# Altium footprint library 5ko.PcbLib: 126 footprints (part 5 of 8)
Each footprint in its own frame and in the unit in brackets; x right, y up, seen from the top. Pads: shape width x height; smd on the part's side, far side on the other; paste and mask are expansions set on the pad; w line width, h text height; cw(c..) or ccw(c..) is an arc to the next point about the centre after c.
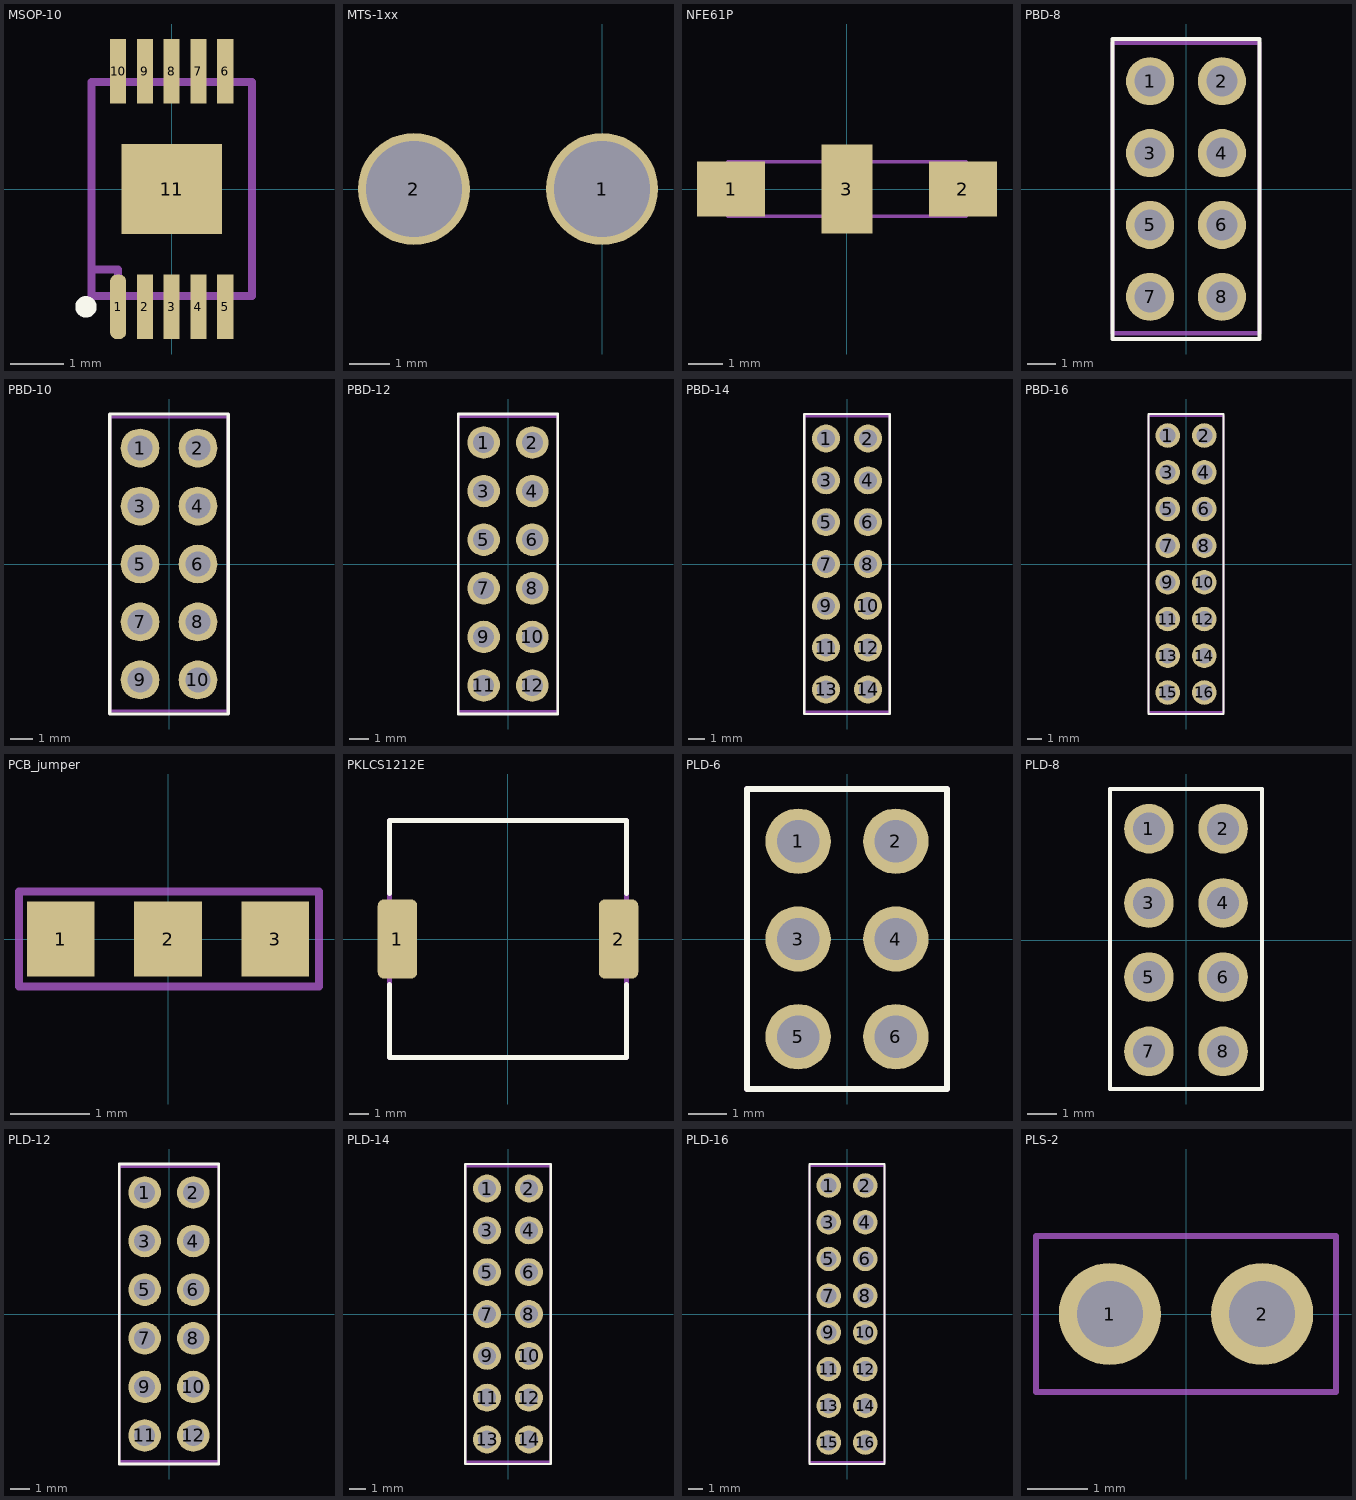
[diagram p4: the footprints below, top view; thin cyan lines are the x and y axes]

## MSOP-10 [mm]
pads (11):
  rrect80% 0.3x1.2 smd mask+0.07: 1(-1,-2.2)
  rect 0.3x1.2 smd mask+0.07: 2(-0.5,-2.2) 3(0,-2.2) 4(0.5,-2.2) 5(1,-2.2) 6(1,2.2) 7(0.5,2.2) 8(0,2.2) 9(-0.5,2.2) 10(-1,2.2)
  rect 1.88x1.68 smd mask+0.07: 11(0,0)
Top Overlay:
  circle w0.2: c-1.6,-2.2 r0.1
Mechanical 15:
  lines w0.15: -1.5,-1.5 -1,-1.5 -1,-2 ; -1.5,-2 1.5,-2 1.5,2 -1.5,2 -1.5,-2
  text ".Designator" at 0.125,-2.1 h0.5
3D body "User Library-MSOP-10-1.step": height 1.05, standoff 0, extent -1.5,-2.514 1.5,2.514

## MTS-1xx [mm]
pads (2):
  round 2.8 hole 2.4 unplated: 1(0,0) 2(-4.7,0)
3D body "MTS-1xx-C2-blue-OFF.step": height 26.03, standoff -5.5, extent -6.8,-5.999 6.6,6

## NFE61P [mm]
pads (3):
  rect 2x1.6 smd: 1(-3.4,0) 2(3.4,0)
  rect 1.5x2.6 smd: 3(0,0)
Mechanical 15:
  lines w0.1: -3.5,-0.8 -3.5,0.8 3.5,0.8 3.5,-0.8 -3.5,-0.8
  text ".Designator" at -1.7,-0.2 h0.5
3D body "NFE61P.STEP": height 1.6, standoff 0, extent -3.4,-0.8 3.4,0.8

## PBD-8 [mm]
pads (8):
  round 1.7 hole 1.1: 1(-1.27,3.81) 2(1.27,3.81) 3(-1.27,1.27) 4(1.27,1.27) 5(-1.27,-1.27) 6(1.27,-1.27) 7(-1.27,-3.81) 8(1.27,-3.81)
Top Overlay:
  lines w0.15: -2.6,-5.3 -2.6,5.3 2.6,5.3 2.6,-5.3 -2.6,-5.3
Mechanical 15:
  lines w0.15: -2.6,-5.1 -2.6,5.17 2.6,5.17 2.6,-5.1 -2.6,-5.1
  text ".Designator" at -1.5,-0.1 h0.5
3D body "User Library-PBD_(DS1023-2)_2line_connectors_h=5_0_8_5mm_step_2_54mm_fixed.step": height 8.5, standoff -3, extent -2.5,-5.32 2.5,5.34

## PBD-10 [mm]
pads (10):
  round 1.7 hole 1.1: 1(-1.27,5.08) 2(1.27,5.08) 3(-1.27,2.54) 4(1.27,2.54) 5(-1.27,0) 6(1.27,0) 7(-1.27,-2.54) 8(1.27,-2.54) 9(-1.27,-5.08) 10(1.27,-5.08)
Top Overlay:
  lines w0.15: -2.6,-6.57 2.6,-6.57 2.6,6.57 -2.6,6.57 -2.6,-6.57
Mechanical 15:
  lines w0.15: -2.6,-6.44 2.6,-6.44 2.6,6.44 -2.6,6.44 -2.6,-6.44
  text ".Designator" at -1.1,-0.2 h0.5
3D body "PBD-10.step": height 8.5, standoff -3, extent -2.48,-6.6 2.52,6.6

## PBD-12 [mm]
pads (12):
  round 1.7 hole 1.1: 1(-1.27,6.35) 2(1.27,6.35) 3(-1.27,3.81) 4(1.27,3.81) 5(-1.27,1.27) 6(1.27,1.27) 7(-1.27,-1.27) 8(1.27,-1.27) 9(-1.27,-3.81) 10(1.27,-3.81) 11(-1.27,-6.35) 12(1.27,-6.35)
Top Overlay:
  lines w0.15: -2.6,-7.84 2.6,-7.84 ; -2.6,-7.83 -2.6,7.84 2.6,7.84 2.6,-7.83
Mechanical 15:
  lines w0.15: -2.6,-7.71 -2.6,7.71 2.6,7.71 2.6,-7.71 -2.6,-7.71
  text ".Designator" at -1,-0.1 h0.5
3D body "PBD-12.step": height 8.5, standoff -3, extent -2.48,-7.87 2.52,7.87

## PBD-14 [mm]
pads (14):
  round 1.7 hole 1.1: 1(-1.27,7.62) 2(1.27,7.62) 3(-1.27,5.08) 4(1.27,5.08) 5(-1.27,2.54) 6(1.27,2.54) 7(-1.27,0) 8(1.27,0) 9(-1.27,-2.54) 10(1.27,-2.54) 11(-1.27,-5.08) 12(1.27,-5.08) 13(-1.27,-7.62) 14(1.27,-7.62)
Top Overlay:
  lines w0.15: -2.6,-9.11 -2.6,9.11 2.6,9.11 2.6,-9.11 -2.6,-9.11
Mechanical 15:
  lines w0.15: -2.6,-8.98 -2.6,8.98 2.6,8.98 2.6,-8.98 -2.6,-8.98
  text ".Designator" at -0.925,-0.025 h0.5
3D body "PBD-14.step": height 8.5, standoff -3, extent -2.48,-9.14 2.52,9.14

## PBD-16 [mm]
pads (16):
  round 1.7 hole 1.1: 1(-1.27,8.89) 2(1.27,8.89) 3(-1.27,6.35) 4(1.27,6.35) 5(-1.27,3.81) 6(1.27,3.81) 7(-1.27,1.27) 8(1.27,1.27) 9(-1.27,-1.27) 10(1.27,-1.27) 11(-1.27,-3.81) 12(1.27,-3.81) 13(-1.27,-6.35) 14(1.27,-6.35) 15(-1.27,-8.89) 16(1.27,-8.89)
Top Overlay:
  lines w0.15: -2.6,-10.38 2.6,-10.38 2.6,10.38 -2.6,10.38 -2.6,-10.38
Mechanical 15:
  lines w0.15: -2.6,-10.25 2.6,-10.25 2.6,10.25 -2.6,10.25 -2.6,-10.25
  text ".Designator" at -0.925,1.245 h0.5
3D body "PBD-16.step": height 8.5, standoff -3, extent -2.48,-10.41 2.52,10.41

## PCB_jumper [mm]
pads (3):
  rect 0.85x0.95 smd: 1(-1.35,0) 2(0,0) 3(1.35,0)
Mechanical 15:
  lines w0.1: -1.875,-0.6 -1.875,0.6 1.9,0.6 1.9,-0.6 -1.875,-0.6
  text ".Designator" at -0.8,-0.1 h0.3

## PKLCS1212E [mm] "Buzzer"
pads (2):
  rrect30% 2x4 smd: 1(-5.6,0) 2(5.6,0)
Top Overlay:
  lines w0.254: -6,-2.3 -6,-6 6,-6 6,-2.3 ; -6,2.3 -6,6 6,6 6,2.3
Mechanical 15:
  lines w0.254: -6,-6 6,-6 6,6 -6,6 -6,-6
  text ".Designator" at -1.7,-0.2 h0.5
3D body "User Library-PKLCS1212E2XXX.STEP": height 3, standoff 0, extent -6,-6 6,6

## PLD-6 [mm]
pads (6):
  round 1.7 hole 1.1: 1(-1.27,2.54) 2(1.27,2.54) 3(-1.27,0) 4(1.27,0) 5(-1.27,-2.54) 6(1.27,-2.54)
Top Overlay:
  lines w0.15: -2.6,-3.9 -2.6,3.9 2.6,3.9 2.6,-3.9 -2.6,-3.9
Mechanical 15:
  lines w0.15: -2.6,-3.9 -2.6,3.9 2.6,3.9 2.6,-3.9 -2.6,-3.9
  text ".Designator" at -1.7,-0.3 h0.5
3D body "User Library-2x3 TH Pitch 2_54mm.STEP": height 9.2, standoff -3.5, extent -2.555,-3.81 2.525,3.81

## PLD-8 [mm]
pads (8):
  round 1.7 hole 1.1: 1(-1.27,3.81) 2(1.27,3.81) 3(-1.27,1.27) 4(1.27,1.27) 5(-1.27,-1.27) 6(1.27,-1.27) 7(-1.27,-3.81) 8(1.27,-3.81)
Top Overlay:
  lines w0.15: -2.6,-5.1 -2.6,5.17 2.6,5.17 2.6,-5.1 -2.6,-5.1
Mechanical 15:
  lines w0.15: -2.6,-5.1 -2.6,5.17 2.6,5.17 2.6,-5.1 -2.6,-5.1
  text ".Designator" at -1.5,-0.1 h0.5
3D body "User Library-PLD8.STEP": height 8.54, standoff -3, extent -2.54,-5.07 2.54,5.09

## PLD-12 [mm]
pads (12):
  round 1.7 hole 1.1: 1(-1.27,6.35) 2(1.27,6.35) 3(-1.27,3.81) 4(1.27,3.81) 5(-1.27,1.27) 6(1.27,1.27) 7(-1.27,-1.27) 8(1.27,-1.27) 9(-1.27,-3.81) 10(1.27,-3.81) 11(-1.27,-6.35) 12(1.27,-6.35)
Top Overlay:
  lines w0.15: -2.6,-7.84 2.6,-7.84 ; -2.6,-7.83 -2.6,7.84 2.6,7.84 2.6,-7.83
Mechanical 15:
  lines w0.15: -2.6,-7.71 -2.6,7.71 2.6,7.71 2.6,-7.71 -2.6,-7.71
  text ".Designator" at -1,-0.1 h0.5
3D body "PLS-12.STEP": height 8.42, standoff -2.95, extent -2.54,-7.62 2.54,7.62

## PLD-14 [mm]
pads (14):
  round 1.7 hole 1.1: 1(-1.27,7.62) 2(1.27,7.62) 3(-1.27,5.08) 4(1.27,5.08) 5(-1.27,2.54) 6(1.27,2.54) 7(-1.27,0) 8(1.27,0) 9(-1.27,-2.54) 10(1.27,-2.54) 11(-1.27,-5.08) 12(1.27,-5.08) 13(-1.27,-7.62) 14(1.27,-7.62)
Top Overlay:
  lines w0.15: -2.6,-9.11 -2.6,9.11 2.6,9.11 2.6,-9.11 -2.6,-9.11
Mechanical 15:
  lines w0.15: -2.6,-8.98 -2.6,8.98 2.6,8.98 2.6,-8.98 -2.6,-8.98
  text ".Designator" at -1,1.17 h0.5
3D body "PLS-7.step": height 8.54, standoff -3, extent -2.54,-8.89 0,8.89
3D body "PLS-7.step": height 8.54, standoff -3, extent 0,-8.89 2.54,8.89

## PLD-16 [mm]
pads (16):
  round 1.7 hole 1.1: 1(-1.27,8.89) 2(1.27,8.89) 3(-1.27,6.35) 4(1.27,6.35) 5(-1.27,3.81) 6(1.27,3.81) 7(-1.27,1.27) 8(1.27,1.27) 9(-1.27,-1.27) 10(1.27,-1.27) 11(-1.27,-3.81) 12(1.27,-3.81) 13(-1.27,-6.35) 14(1.27,-6.35) 15(-1.27,-8.89) 16(1.27,-8.89)
Top Overlay:
  lines w0.15: -2.6,-10.38 2.6,-10.38 2.6,10.38 -2.6,10.38 -2.6,-10.38
Mechanical 15:
  lines w0.15: -2.6,-10.25 2.6,-10.25 2.6,10.25 -2.6,10.25 -2.6,-10.25
  text ".Designator" at -1,2.44 h0.5
3D body "PLD-16.step": height 8.6, standoff -3, extent -2.5,-10.16 2.5,10.16

## PLS-2 [mm]
pads (2):
  round 1.7 hole 1.1: 1(-1.27,0) 2(1.27,0)
Mechanical 15:
  lines w0.1: -2.5,-1.3 2.5,-1.3 2.5,1.3 -2.5,1.3 -2.5,-1.3
  text ".Designator" at -1.7,-0.1 h0.5
3D body "PLS2.STEP": height 8.54, standoff -3, extent -2.54,-1.27 2.54,1.27